# Altium footprint library NDLib.PCBLIB: 499 footprints (part 1 of 32)
Each footprint in its own frame and in the unit in brackets; x right, y up, seen from the top. Pads: shape width x height; smd on the part's side, far side on the other; paste and mask are expansions set on the pad; w line width, h text height; cw(c..) or ccw(c..) is an arc to the next point about the centre after c.
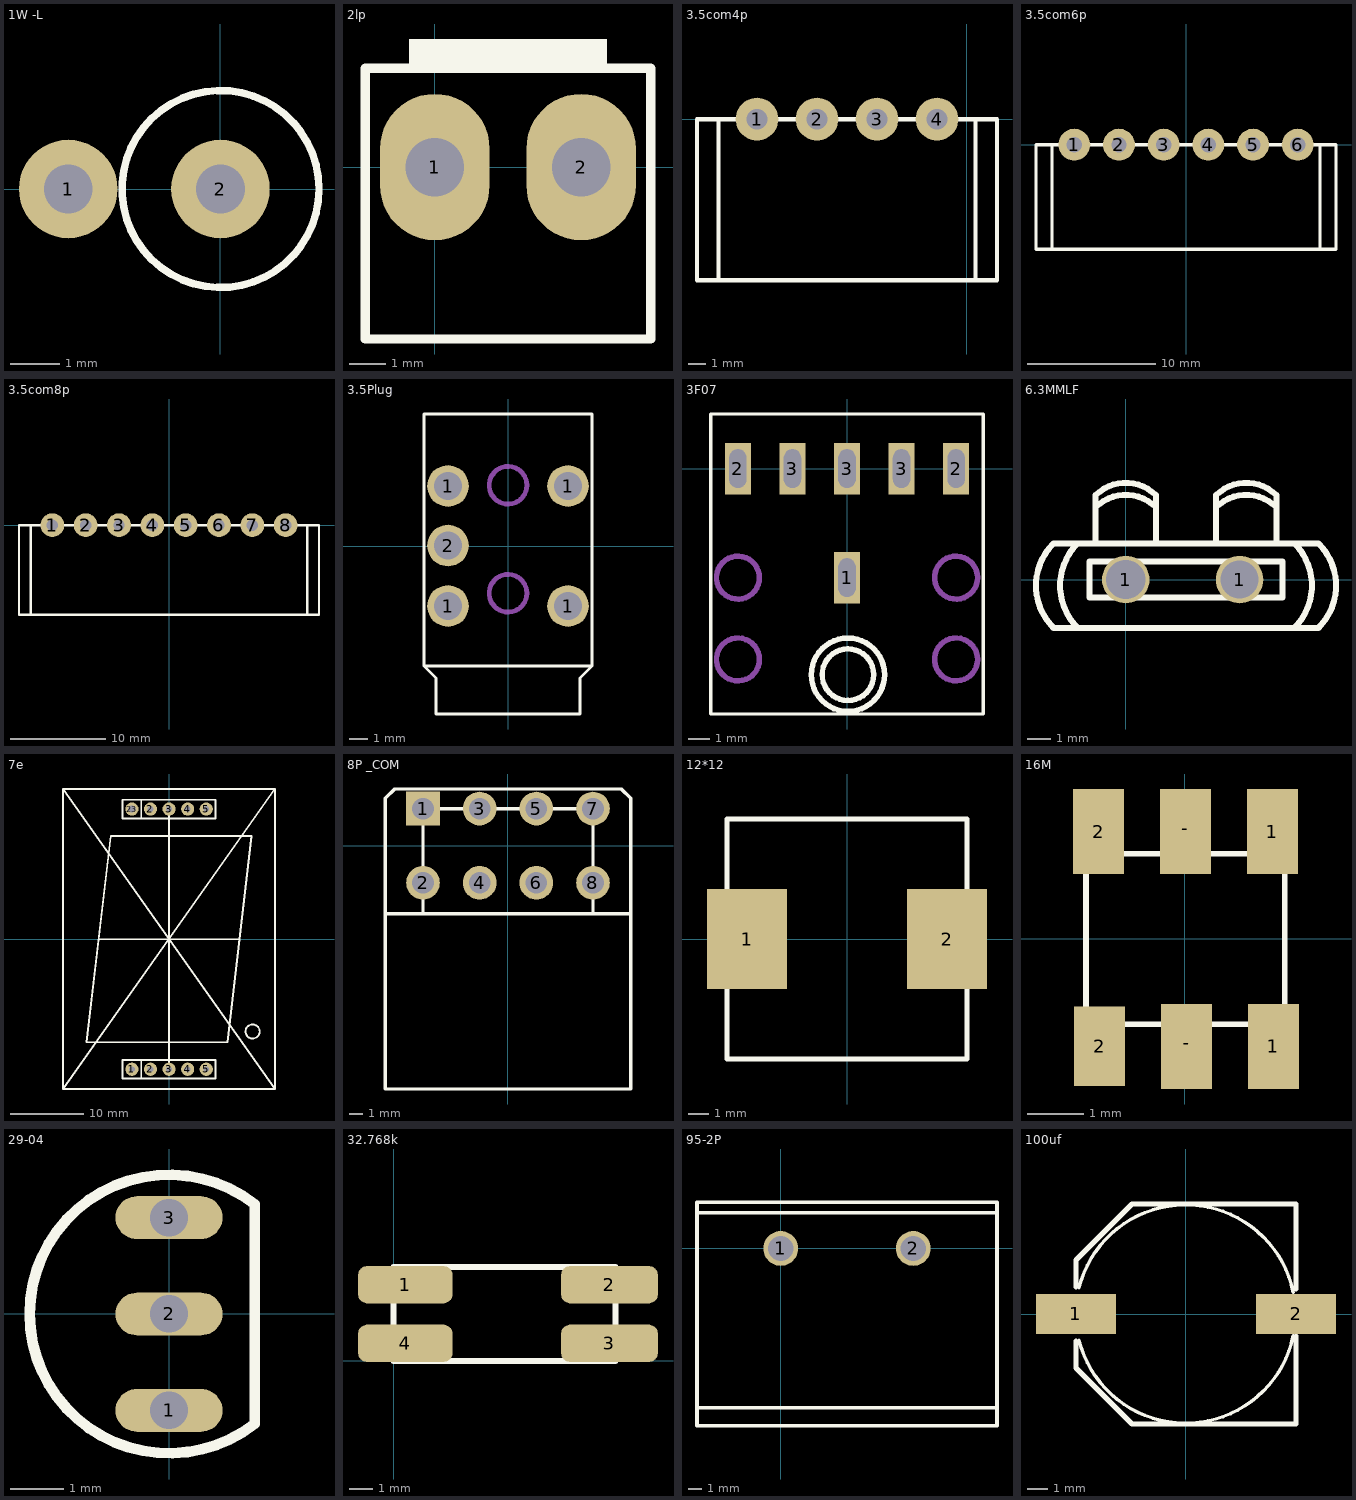
[diagram p0: the footprints below, top view; thin cyan lines are the x and y axes]

## 1W -L [mil]
pads (2):
  round 79 hole 39: 1(-122.05,0) 2(0,0)
TopOverlay:
  circle w6: c0,0 r79
3D body: height 572.61, standoff -75.5, extent -137.23,-83.35 83.23,82

## 2lp [mm]
pads (2):
  oval 3x4 hole 1.6: 1(0.006,0.011) 2(4.006,0.011)
TopOverlay:
  rectangle: -0.694,2.611 4.706,3.511
  rectangle: -0.694,2.611 4.706,3.111
  lines w0.254: -1.894,-4.689 -1.894,2.711 5.906,2.711 5.906,-4.689 2.506,-4.689 -1.894,-4.689

## 3.5com4p [mm]
pads (4):
  round 2.5 hole 1.2: 1(-12.25,0) 2(-8.75,0) 3(-5.25,0) 4(-1.75,0)
TopOverlay:
  lines w0.254: -14.5,-9.4 -14.5,0 ; 0.5,-9.4 0.5,0 ; -15.75,-9.4 -14,-9.4 -7,-9.4 1.75,-9.4 1.75,0 -7,0 -14,0 -15.75,0 -15.75,-9.4

## 3.5com6p [mm]
pads (6):
  round 2.5 hole 1.2: 1(-8.75,0) 2(-5.25,0) 3(-1.75,0) 4(1.75,0) 5(5.25,0) 6(8.75,0)
TopOverlay:
  lines w0.254: -10.5,-8.2 -11.75,-8.2 -11.75,0 -10.5,0 ; -10.5,-8.2 -10.5,0 ; -10.5,-8.2 10.5,-8.2 ; -10.5,0 10.5,0 ; 10.5,-8.2 11.75,-8.2 11.75,0 10.5,0 ; 10.5,-8.2 10.5,0

## 3.5com8p [mm]
pads (8):
  round 2.5 hole 1.2: 1(-12.25,0) 2(-8.75,0) 3(-5.25,0) 4(-1.75,0) 5(1.75,0) 6(5.25,0) 7(8.75,0) 8(12.25,0)
TopOverlay:
  lines w0.254: -14.5,-9.4 -14.5,0 ; 14.5,-9.4 14.5,0 ; -15.75,-9.4 -14,-9.4 7,-9.4 15.75,-9.4 15.75,0 7,0 -14,0 -15.75,0 -15.75,-9.4

## 3.5Plug [mm]
pads (5):
  round 2.2 hole 1.5: 1(-3.175,-3.175) 1(-3.175,3.175) 1(3.175,-3.175) 1(3.175,3.175) 2(-3.175,0.025)
TopOverlay:
  lines w0.152: -4.445,-6.35 -3.81,-6.985 -3.81,-8.89 3.81,-8.89 ; -4.445,-6.35 -4.445,6.985 4.445,6.985 4.445,-6.35 ; -4.445,-6.35 4.445,-6.35 ; 3.81,-8.89 3.81,-6.985 ; 3.81,-8.89 3.81,-6.985 ; 3.81,-6.985 4.445,-6.35 ; 3.81,-6.985 4.445,-6.35
Mechanical1:
  circle w0.254: c0,-2.5 r1
  circle w0.254: c0,3.215 r1

## 3F07 [mm]
pads (6):
  rect 1.2x2.4 hole 0.8 slot 1.8 at 90 deg: 1(0,-5.08) 2(-5.08,0) 2(5.08,0) 3(-2.54,0) 3(0,0) 3(2.54,0)
TopOverlay:
  circle w0.254: c0.044,-9.6 r1.706
  circle w0.254: c0.044,-9.6 r1.2
  lines w0.152: -6.35,-11.43 -6.35,2.54 6.35,2.54 6.35,-11.43 -6.35,-11.43
Mechanical1:
  circle w0.254: c5.08,-8.89 r1
  circle w0.254: c-5.08,-8.89 r1
  circle w0.254: c5.08,-5.08 r1
  circle w0.254: c-5.08,-5.08 r1

## 6.3MMLF [mm]
pads (2):
  round 2 / inner round 2 / far side round 4 hole 1.65: 1(0,0)
  round 2 / inner round 2 / far side round 4 hole 1.6: 1(4.8,0)
TopOverlay:
  lines w0.254: -2.032,-2.032 cw(c-0.254,-0.254) -2.032,1.524 ; -1.27,1.524 -1.27,3.556 cw(c0,2.286) 1.27,3.556 1.27,1.524 ; -1.27,3.048 cw(c0,1.778) 1.27,3.048 ; 3.81,1.524 3.81,3.556 cw(c5.08,2.286) 6.35,3.556 6.35,1.524 ; 3.81,3.048 cw(c5.08,1.778) 6.35,3.048 ; 7.112,-2.032 ccw(c5.334,-0.254) 7.112,1.524 ; -3.048,-2.032 cw(c-1.27,-0.254) -3.048,1.524 8.128,1.524 cw(c6.35,-0.254) 8.128,-2.032 -3.048,-2.032 ; -1.524,-0.762 -1.524,0.762 6.604,0.762 6.604,-0.762 -1.524,-0.762

## 7e [mm]
pads (10):
  round 1.8 hole 0.813: 1(-5.075,-17.739) 2(-2.535,-17.739) 2(-2.535,17.821) 3(0.005,-17.739) 3(0.005,17.821) 4(2.545,-17.739) 4(2.545,17.821) 5(5.085,-17.739) 5(5.085,17.821)
  round 1.8 hole 1: 23(-5.075,17.821)
TopOverlay:
  lines w0.254: -14.475,20.561 14.465,20.561 ; -9.655,0.021 9.645,0.021 ; -3.805,-19.009 -3.805,-16.469 ; -3.805,16.551 -3.805,19.091 ; 0.005,-17.739 0.005,17.821 ; 12.39,-12.638 cw(c11.425,-12.579) 12.392,-12.579 ; 14.465,20.401 14.465,20.561 ; -14.495,-20.439 14.465,20.561 ; -14.495,-20.439 14.485,-20.439 ; -14.495,-20.439 -14.495,20.541 -14.475,20.541 14.485,-20.439 ; 14.465,20.561 14.465,-20.419 14.485,-20.439 ; -11.275,-14.059 -7.975,14.141 11.285,14.141 7.985,-14.059 -11.275,-14.059 ; -6.345,-19.009 6.355,-19.009 6.355,-16.469 -6.345,-16.469 -6.345,-19.009 ; -6.345,16.551 6.355,16.551 6.355,19.091 -6.345,19.091 -6.345,16.551

## 8P _COM [mm]
pads (8):
  rect 2.5x2.5 hole 1.6: 1(-6.3,2.75)
  round 2.5 hole 1.6: 2(-6.3,-2.75) 3(-2.1,2.75) 4(-2.1,-2.75) 5(2.1,2.75) 6(2.1,-2.75) 7(6.3,2.75) 8(6.3,-2.75)
TopOverlay:
  lines w0.254: -9.1,-18.036 9.1,-18.036 9.1,-5.036 ; -9.1,-17.99 -9.1,-4.99 ; -6.3,-4.99 -6.3,-0.996 -6.3,2.75 2.1,2.75 6.3,2.75 ; 6.3,-5.036 6.3,0.404 6.3,2.75 ; 6.3,2.75 6.3,2.75 ; 9.1,-5.036 9.1,3.5 8.4,4.2 -8.4,4.2 -9.1,3.5 -9.1,-5.036 9.1,-5.036

## 12*12 [mm]
height 3
pads (2):
  rect 4x5 smd: 1(-5,0) 2(5,0)
TopOverlay:
  lines w0.254: -6,-6 6,-6 6,6 -6,6 -6,-6

## 16M [mm]
pads (6):
  rect 0.9x1.5 smd: 1(1.542,1.888) 1(1.562,-1.892) 2(-1.518,1.888) -(0.012,1.888) -(0.032,-1.892)
  rect 0.9x1.4 smd: 2(-1.498,-1.892)
TopOverlay:
  lines w0.1: -1.718,-1.502 1.782,-1.502 ; -1.738,-1.492 -1.738,1.498 1.762,1.498 1.762,-1.502 -1.728,-1.502 -1.738,-1.492

## 29-04 [mm] "TO, Flat Index; 3 In-Line, Axial Leads; Body Dia. 4.8mm; Leads 0.48 x 0.5 mm (max)"
height 5.33
pads (3):
  oval 2x0.8 hole 0.7: 1(0,-1.8) 2(0,0) 3(0,1.8)
TopOverlay:
  lines w0.2: 1.601,-2.049 cw(c0,0) 1.601,2.049 ; 1.6,-1.99 1.6,1.99
3D body: height 3, standoff 0, extent -0.25,-2.04 0.25,-1.6
3D body: height 3, standoff 0, extent -0.25,-0.22 0.25,0.22
3D body: height 3, standoff 0, extent -0.246,1.583 0.254,2.023
3D body: height 8, standoff 3, extent -2.612,-2.6 1.657,2.602

## 32.768k [mm]
pads (4):
  rrect50% 4.1x1.62 smd: 1(0.508,3.302) 4(0.508,0.762)
  rrect50% 4.2x1.62 smd: 2(9.346,3.302) 3(9.346,0.762)
TopOverlay:
  lines w0.254: 0,0 0,4.06 9.6,4.06 9.6,0 0,0

## 95-2P [mm]
pads (2):
  round 2.5 hole 1.8: 1(0,0) 2(9.5,0)
TopOverlay:
  lines w0.254: -6,-11.43 15.5,-11.43 ; -6,2.54 15.5,2.54 ; -6,-12.7 15.5,-12.7 15.5,3.3 -6,3.3 -6,-12.7

## 100uf [mm]
pads (2):
  rect 4x2 smd: 1(-5.5,0) 2(5.5,0)
TopOverlay:
  lines w0.17: -5.351,-1.312 ccw(c-0.02,0.04) 5.365,-1.079 ; -5.351,1.312 cw(c-0.02,-0.04) 5.365,1.079
  lines w0.254: -5.5,-1.35 -5.5,-2.7 -3.7,-4.5 -2.7,-5.5 5.5,-5.5 5.5,-1.106 ; -5.5,1.35 -5.5,2.7 -4.5,3.7 -2.7,5.5 5.5,5.5 5.5,1.247